# Altium footprint library THU VIEN PCB.PCBLib: 911 footprints (part 36 of 57)
Each footprint in its own frame and in the unit in brackets; x right, y up, seen from the top. Pads: shape width x height; smd on the part's side, far side on the other; paste and mask are expansions set on the pad; w line width, h text height; cw(c..) or ccw(c..) is an arc to the next point about the centre after c.
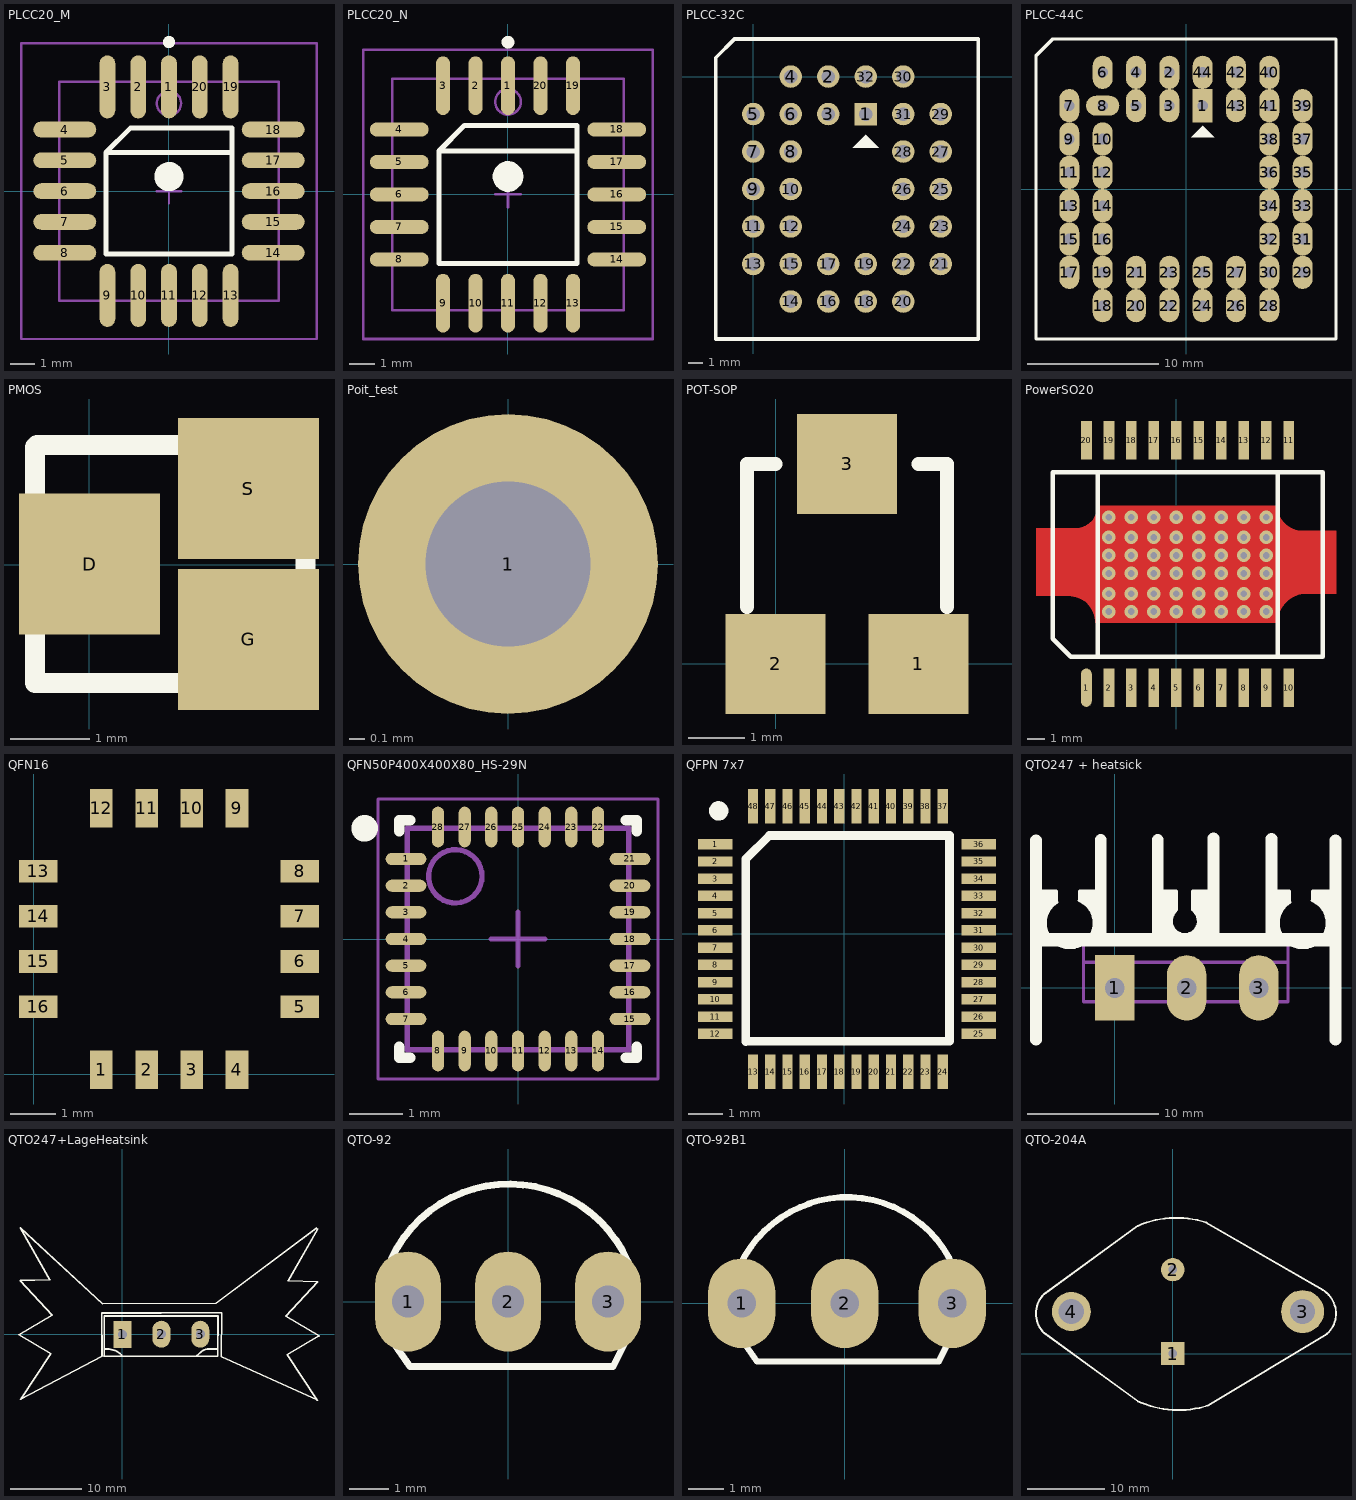
[diagram p35: the footprints below, top view; thin cyan lines are the x and y axes]

## PLCC20_M [mm] "Leaded Chip Carrier, 20-Leads, Body 9x9mm, Pitch 1.27mm, IPC Low Density"
height 4.57
pads (20):
  oval 0.65x2.6 smd: 1(0,4.3) 2(-1.27,4.3) 3(-2.54,4.3) 9(-2.54,-4.3) 10(-1.27,-4.3) 11(0,-4.3) 12(1.27,-4.3) 13(2.54,-4.3) 19(2.54,4.3) 20(1.27,4.3)
  oval 2.6x0.65 smd: 4(-4.3,2.54) 5(-4.3,1.27) 6(-4.3,0) 7(-4.3,-1.27) 8(-4.3,-2.54) 14(4.3,-2.54) 15(4.3,-1.27) 16(4.3,0) 17(4.3,1.27) 18(4.3,2.54)
Top Overlay:
  circle w0.25: c0,6.15 r0.125
  circle w0.6: c0,0.6 r0.3
  lines w0.2: 2.6,1.6 -2.6,1.6 ; -2.6,1.6 -1.6,2.6 2.6,2.6 2.6,-2.6 -2.6,-2.6 -2.6,1.6
Mechanical 13:
  circle w0.1: c0,3.62 r0.5
  lines w0.1: -4.52,-4.52 -4.52,4.52 4.52,4.52 4.52,-4.52 -4.52,-4.52
Mechanical 15:
  lines w0.1: -0.5,0 0.5,0 ; 0,-0.5 0,0.5 ; -6.1,-6.1 -6.1,6.1 6.1,6.1 6.1,-6.1 -6.1,-6.1
3D body: height 4.57, standoff 0, extent -4.52,-4.52 4.52,4.52

## PLCC20_N [mm] "Leaded Chip Carrier, 20-Leads, Body 9x9mm, Pitch 1.27mm, IPC Medium Density"
height 4.57
pads (20):
  oval 0.55x2.3 smd: 1(0,4.25) 2(-1.27,4.25) 3(-2.54,4.25) 9(-2.54,-4.25) 10(-1.27,-4.25) 11(0,-4.25) 12(1.27,-4.25) 13(2.54,-4.25) 19(2.54,4.25) 20(1.27,4.25)
  oval 2.3x0.55 smd: 4(-4.25,2.54) 5(-4.25,1.27) 6(-4.25,0) 7(-4.25,-1.27) 8(-4.25,-2.54) 14(4.25,-2.54) 15(4.25,-1.27) 16(4.25,0) 17(4.25,1.27) 18(4.25,2.54)
Top Overlay:
  circle w0.25: c0,5.95 r0.125
  circle w0.6: c0,0.7 r0.3
  lines w0.2: 2.7,1.7 -2.7,1.7 ; -2.7,1.7 -1.7,2.7 2.7,2.7 2.7,-2.7 -2.7,-2.7 -2.7,1.7
Mechanical 13:
  circle w0.1: c0,3.62 r0.5
  lines w0.1: -4.52,-4.52 -4.52,4.52 4.52,4.52 4.52,-4.52 -4.52,-4.52
Mechanical 15:
  lines w0.1: -0.5,0 0.5,0 ; 0,-0.5 0,0.5 ; -5.65,-5.65 -5.65,5.65 5.65,5.65 5.65,-5.65 -5.65,-5.65
3D body: height 4.57, standoff 0, extent -4.52,-4.52 4.52,4.52

## PLCC-32C [mil] "Socket PLCC32R"
height 200
pads (32):
  rect 60x60 hole 36: 1(300,-100)
  round 60 hole 36: 2(200,0) 3(200,-100) 4(100,0) 5(0,-100) 6(100,-100) 7(0,-200) 8(100,-200) 9(0,-300) 10(100,-300) 11(0,-400) 12(100,-400) 13(0,-500) 14(100,-600) 15(100,-500) 16(200,-600) 17(200,-500) 18(300,-600) 19(300,-500) 20(400,-600) 21(500,-500) 22(400,-500) 23(500,-400) 24(400,-400) 25(500,-300) 26(400,-300) 27(500,-200) 28(400,-200) 29(500,-100) 30(400,0) 31(400,-100) 32(300,0)
Top Overlay:
  region: 300,-155 265,-190 335,-190
  lines w10: -100,-700 600,-700 600,100 -50,100 -100,50 -100,-700

## PLCC-44C [mil] "QPC-44C"
height 200
pads (44):
  rect 60x100 hole 32: 1(50,250)
  oval 60x100 hole 32: 2(-50,350) 3(-50,250) 4(-150,350) 5(-150,250) 6(-250,350) 7(-350,250) 9(-350,150) 10(-250,150) 11(-350,50) 12(-250,50) 13(-350,-50) 14(-250,-50) 15(-350,-150) 16(-250,-150) 17(-350,-250) 18(-250,-350) 19(-250,-250) 20(-150,-350) 21(-150,-250) 22(-50,-350) 23(-50,-250) 24(50,-350) 25(50,-250) 26(150,-350) 27(150,-250) 28(250,-350) 29(350,-250) 30(250,-250) 31(350,-150) 32(250,-150) 33(350,-50) 34(250,-50) 35(350,50) 36(250,50) 37(350,150) 38(250,150) 39(350,250) 40(250,350) 41(250,250) 42(150,350) 43(150,250) 44(50,350)
  oval 100x60 hole 32: 8(-250,250)
Top Overlay:
  region: 50,190 15,155 85,155
  lines w10: -450,-450 -450,400 -400,450 450,450 450,-450 -450,-450

## PMOS [mil]
pads (3):
  rect 70x70 smd: D(0.25,0.25) G(78.99,-37.15) S(78.99,37.65)
Top Overlay:
  lines w10: -26.75,-58.75 107.25,-58.75 107.25,59.25 -25.75,59.25 -26.75,58.25 -26.75,-58.75

## Poit_test [mm]
pads (1):
  round 2 hole 1.1: 1(0,0)

## POT-SOP [mil]
pads (3):
  rect 70x70 smd: 1(100,0) 2(0,0) 3(50,140)
Top Overlay:
  lines w10: -20,40 -20,140 0,140 ; 100,140 120,140 120,40

## PowerSO20 [mil]
pads (20):
  oval 24x85 smd: 1(-200,220.87)
  rect 24x85 smd: 2(-150,220.87) 3(-100,220.87) 4(-50,220.87) 5(0,220.87) 6(50,220.87) 7(100,220.87) 8(150,220.87) 9(200,220.87) 10(250,220.87) 11(250,770.87) 12(200,770.87) 13(150,770.87) 14(100,770.87) 15(50,770.87) 16(0,770.87) 17(-50,770.87) 18(-100,770.87) 19(-150,770.87) 20(-200,770.87)
via 200,390 diameter 30 hole 15
via 150,390 diameter 30 hole 15
via 100,390 diameter 30 hole 15
via 50,390 diameter 30 hole 15
via 0,390 diameter 30 hole 15
via -50,390 diameter 30 hole 15
via -100,390 diameter 30 hole 15
via -150,390 diameter 30 hole 15
via 200,430 diameter 30 hole 15
via 150,430 diameter 30 hole 15
via 100,430 diameter 30 hole 15
via 50,430 diameter 30 hole 15
via 0,430 diameter 30 hole 15
via -50,430 diameter 30 hole 15
via -100,430 diameter 30 hole 15
via -150,430 diameter 30 hole 15
via 200,475 diameter 30 hole 15
via 150,475 diameter 30 hole 15
via 100,475 diameter 30 hole 15
via 50,475 diameter 30 hole 15
via 0,475 diameter 30 hole 15
via -50,475 diameter 30 hole 15
via -100,475 diameter 30 hole 15
via -150,475 diameter 30 hole 15
via 200,515 diameter 30 hole 15
via 150,515 diameter 30 hole 15
via 100,515 diameter 30 hole 15
via 50,515 diameter 30 hole 15
via 0,515 diameter 30 hole 15
via -50,515 diameter 30 hole 15
via -100,515 diameter 30 hole 15
via -150,515 diameter 30 hole 15
via 200,555 diameter 30 hole 15
via 150,555 diameter 30 hole 15
via 100,555 diameter 30 hole 15
via 50,555 diameter 30 hole 15
via 0,555 diameter 30 hole 15
via -50,555 diameter 30 hole 15
via -100,555 diameter 30 hole 15
via -150,555 diameter 30 hole 15
via -150,600 diameter 30 hole 15
via -100,600 diameter 30 hole 15
via -50,600 diameter 30 hole 15
via 0,600 diameter 30 hole 15
via 50,600 diameter 30 hole 15
via 100,600 diameter 30 hole 15
via 150,600 diameter 30 hole 15
via 200,600 diameter 30 hole 15
Top Layer:
  region: 355,570 355,430 290,430 283.63,429.69 271.13,427.2 259.36,422.32 248.76,415.25 239.75,406.24 232.68,395.64 227.8,383.87 225.31,371.37 225,365 -180,365 -180.29,370.88 -182.58,382.42 -187.08,393.28 -193.62,403.06 -201.94,411.38 -211.72,417.92 -222.58,422.42 -234.12,424.71 -240,425 -312,425 -312,575 -225,575 -220.1,575.24 -210.49,577.15 -201.43,580.9 -193.28,586.35 -186.35,593.28 -180.9,601.43 -177.15,610.49 -175.24,620.1 -175,625 225,625 225.26,619.61 227.37,609.03 231.49,599.07 237.48,590.11 245.11,582.48 254.07,576.49 264.03,572.37 274.61,570.26 280,570
Top Overlay:
  lines w10: -175,290 -175,695 ; 225,295 225,695 ; -275,330 -275,700 325,700 325,300 325,290 -235,290 -275,330
3D body "PowerSO20.STEP": height 141.73, standoff 0, extent -289.92,211.54 340,778.46

## QFN16 [mm] "QFN 16 LEAD 6x6mm"
height 2
pads (16):
  rect 0.5x0.85 smd: 1(1.5,0.104) 2(2.5,0.104) 3(3.5,0.104) 4(4.5,0.104) 9(4.5,5.89) 10(3.5,5.89) 11(2.5,5.89) 12(1.5,5.89)
  rect 0.85x0.5 smd: 5(5.89,1.5) 6(5.89,2.5) 7(5.89,3.5) 8(5.89,4.5) 13(0.1,4.5) 14(0.1,3.5) 15(0.1,2.5) 16(0.1,1.5)
3D body: height 0.8, standoff 0, extent 0,0 6,6

## QFN50P400X400X80_HS-29N [mil] "QFN, 28-Leads, Body 4,00x4,00mm, Pitch 0,50mm, Thermal Pad 3,25x3,25mm, IPC Medium Density"
height 31.5
pads (28):
  oval 30x9 smd: 1(-82.68,59.06) 2(-82.68,39.37) 3(-82.68,19.69) 4(-82.68,0) 5(-82.68,-19.68) 6(-82.68,-39.37) 7(-82.68,-59.06) 15(82.68,-59.06) 16(82.68,-39.37) 17(82.68,-19.68) 18(82.68,0) 19(82.68,19.69) 20(82.68,39.37) 21(82.68,59.06)
  oval 9x30 smd: 8(-59.06,-82.68) 9(-39.37,-82.68) 10(-19.69,-82.68) 11(0,-82.68) 12(19.68,-82.68) 13(39.37,-82.68) 14(59.06,-82.68) 22(59.06,82.68) 23(39.37,82.68) 24(19.68,82.68) 25(0,82.68) 26(-19.69,82.68) 27(-39.37,82.68) 28(-59.06,82.68)
Top Overlay:
  circle w9.84: c-113.19,81.69 r4.92
  lines w7.87: -87.6,-79.72 -87.6,-87.6 -79.72,-87.6 ; -87.6,79.72 -87.6,87.6 -79.72,87.6 ; 79.72,-87.6 87.6,-87.6 87.6,-79.72 ; 79.72,87.6 87.6,87.6 87.6,79.72
Mechanical 13:
  circle w3.94: c-46.26,46.26 r19.68
  lines w3.94: -81.69,-81.69 -81.69,81.69 81.69,81.69 81.69,-81.69 -81.69,-81.69
Mechanical 15:
  lines w1.97: -103.35,-103.35 -103.35,103.35 103.35,103.35 103.35,-103.35 -103.35,-103.35
  lines w3.94: -19.69,0 19.68,0 ; 0,-19.68 0,19.69
3D body: height 31.5, standoff 0.39, extent -81.69,-81.69 81.69,81.69

## QFPN 7x7 [mm]
pads (48):
  rect 1x0.3 smd: 1(-3.747,2.603) 2(-3.747,2.104) 3(-3.747,1.603) 4(-3.747,1.104) 5(-3.747,0.603) 6(-3.747,0.103) 7(-3.747,-0.396) 8(-3.747,-0.897) 9(-3.747,-1.396) 10(-3.747,-1.897) 11(-3.747,-2.397) 12(-3.747,-2.896) 25(3.903,-2.896) 26(3.903,-2.397) 27(3.903,-1.897) 28(3.903,-1.396) 29(3.903,-0.897) 30(3.903,-0.396) 31(3.903,0.103) 32(3.903,0.603) 33(3.903,1.104) 34(3.903,1.603) 35(3.903,2.104) 36(3.903,2.603)
  rect 0.3x1 smd: 13(-2.647,-3.996) 14(-2.147,-3.996) 15(-1.647,-3.996) 16(-1.147,-3.996) 17(-0.647,-3.996) 18(-0.147,-3.996) 19(0.353,-3.996) 20(0.853,-3.996) 21(1.353,-3.996) 22(1.853,-3.996) 23(2.353,-3.996) 24(2.853,-3.996) 37(2.853,3.704) 38(2.353,3.704) 39(1.853,3.704) 40(1.353,3.704) 41(0.853,3.704) 42(0.353,3.704) 43(-0.147,3.704) 44(-0.647,3.704) 45(-1.147,3.704) 46(-1.647,3.704) 47(-2.147,3.704) 48(-2.647,3.704)
Top Overlay:
  circle w0.254: c-3.645,3.581 r0.051
  circle w0.254: c-3.645,3.569 r0.155
  lines w0.254: -2.857,2.045 -2.857,2.172 -2.172,2.857 3.048,2.857 3.048,2.794 3.048,-3.099 3.061,-3.111 2.934,-3.111 -2.845,-3.111 -2.857,-3.124 -2.857,-3.035 -2.857,2.121

## QTO247 + heatsick [mm]
pads (3):
  rect 3x5 hole 1.5: 1(0,0)
  oval 3x5 hole 1.5: 2(5.5,0) 3(11,0)
Top Overlay:
  region: -5.715,7.366 -4.445,7.366 -4.445,6.477 -4.572,6.477 -5.08,5.969 -5.08,5.715 -5.334,5.461 -5.334,4.572 -5.207,4.445 -5.207,4.064 -5.715,4.064
  region: -2.667,7.366 -2.667,6.731 -2.159,6.223 -2.032,6.223 -1.778,5.969 -1.778,5.715 -1.651,5.588 -1.651,4.064 -1.016,4.064 -0.889,4.191 -1.27,4.572 -1.27,7.366
  region: 15.113,7.366 15.113,6.731 15.621,6.223 15.748,6.223 16.002,5.969 16.002,5.715 16.129,5.588 16.129,4.064 16.764,4.064 16.891,4.191 16.51,4.572 16.51,7.366
  region: 12.065,7.366 13.335,7.366 13.335,6.477 13.208,6.477 12.7,5.969 12.7,5.715 12.446,5.461 12.446,4.572 12.573,4.445 12.573,4.064 12.065,4.064
  region: 3.556,7.366 4.826,7.366 4.826,6.096 4.318,5.588 4.318,4.572 4.826,4.064 3.556,4.064
  region: 5.842,7.366 7.366,7.366 7.366,3.81 7.112,4.064 5.842,4.064 6.35,4.572 6.35,5.588 5.842,6.096
  lines w0.254: -5.715,7.366 -4.445,7.366 -4.445,6.604 ; -4.412,6.55 ccw(c-3.429,4.953) -2.69,6.677 ; -2.667,6.731 -2.667,7.366 -1.397,7.366 ; 3.302,7.366 4.699,7.366 4.699,5.969 4.572,5.842 ; 4.622,5.835 ccw(c5.355,5.101) 6.089,5.835 ; 6.096,5.842 5.969,5.969 5.969,7.366 7.112,7.366 ; 12.065,7.366 13.335,7.366 13.335,6.604 ; 13.368,6.55 ccw(c14.351,4.953) 15.09,6.677 ; 15.113,6.731 15.113,7.366 16.383,7.366
  lines w0.889: -6.003,-3.962 -6.003,11.278 ; -1.067,3.785 -1.067,11.303 ; 3.277,3.785 3.277,11.303 ; 7.544,3.759 7.544,11.43 ; 11.963,3.759 11.963,11.379 ; 16.857,-3.962 16.857,11.278
  lines w1.016: -5.842,3.683 16.637,3.683
Mechanical 1:
  lines w0.254: -2.373,1.952 13.227,1.952 ; -2.373,-1.048 -2.373,3.452 13.227,3.452 13.227,-1.048 -2.373,-1.048
3D body "User Library-heat sink-1.STEP": height 30.64, standoff 0.02, extent -6.421,-4.233 16.479,12.167
3D body "SW3dPS-TO-247.STEP": height 23.89, standoff -12.18, extent -2.337,-1.854 12.903,2.718

## QTO247+LageHeatsink [mm]
pads (3):
  rect 2.54x3.81 hole 1.27: 1(0,-0.025)
  oval 2.54x3.81 hole 1.27: 2(5.5,0) 3(11,0)
Top Overlay:
  lines w0.254: -2.591,-3.073 -2.565,-3.048 -2.565,2.591 13.488,2.591 13.463,-3.099 -2.565,-3.099 -2.54,-3.073 ; -2.54,-2.083 -2.151,-2.083 cw(c-2.151,-4.945) -0.127,-2.921 ; 5.283,3.023 14.025,3.023 13.971,-3.168 27.483,-9.246 ; 5.436,2.997 -2.921,2.997 -2.87,-3.099 -14.376,-9.169 -10.109,-2.743 -14.605,-0.076 -9.931,2.692 -14.427,7.569 -10.236,7.696 -14.427,15.037 -2.819,4.318 13.208,4.369 27.381,14.986 ; 10.541,-3.023 ccw(c10.541,-2.961) 10.584,-3.005 11.024,-2.565 cw(c12.189,-3.731) 12.189,-2.083 13.462,-2.083 ; 27.534,-9.322 23.266,-2.896 27.762,-0.229 23.089,2.54 27.584,7.417 23.393,7.544 27.584,14.884
3D body "SW3dPS-aavid 6298b.STEP": height 27.94, standoff 2.54, extent -15.723,-8.357 26.187,16.078
3D body "SW3dPS-to-247ad.STEP": height 25.57, standoff -15.5, extent -2.387,-2.54 13.563,2.49

## QTO-92 [mil] "TO-92"
height 200
pads (3):
  oval 66x100 hole 32: 1(-100,0) 2(0,0) 3(100,0)
Top Overlay:
  lines w7: -116.52,43.21 cw(c0.97,-12.43) 119.94,39.97 ; -115.34,-40.24 -98,-65 105,-65 118,-39
3D body "SW3dPS-TO92.STEP": height 245.04, standoff -199.79, extent -108.87,-65.56 108.86,95

## QTO-92B1 [mil] "TO-92"
height 200
pads (3):
  oval 75x100 hole 32: 1(-115,0) 2(0,0) 3(120,0)
Top Overlay:
  lines w7: -116.52,43.21 cw(c0.97,-12.43) -38.82,111.34 ; -115.34,-40.24 -98,-65 105,-65 118,-39 ; -40.42,111.21 cw(c2.42,-11.53) 121.49,40.65
3D body "SW3dPS-TO92.STEP": height 245.04, standoff -199.79, extent -112.74,-65.56 105,95

## QTO-204A [mil] "Pin For 2N3055, 2N2955"
pads (4):
  rect 120x120 hole 45: 1(0,0)
  round 120 hole 45: 2(0,430)
  round 220 hole 130: 3(665,215)
  round 200 hole 130: 4(-520,215)
Top Overlay:
  lines w10: -660,105 cw(c-560,205) -660,305 -179.46,654.16 ; -659.88,104.89 -178.69,-244.72 ; -179.53,654.34 cw(c18.37,195.17) 171.59,671.11 ; -178.9,-245.19 ccw(c28.37,209.83) 180.47,-266.47 ; 171.46,670.71 769.34,325.52 ; 180.28,-266.15 789.88,100.13 ccw(c695,205) 769.25,325.36